# Altium footprint library MODULE.PcbLib: 35 footprints (part 1 of 3)
Each footprint in its own frame and in the unit in brackets; x right, y up, seen from the top. Pads: shape width x height; smd on the part's side, far side on the other; paste and mask are expansions set on the pad; w line width, h text height; cw(c..) or ccw(c..) is an arc to the next point about the centre after c.
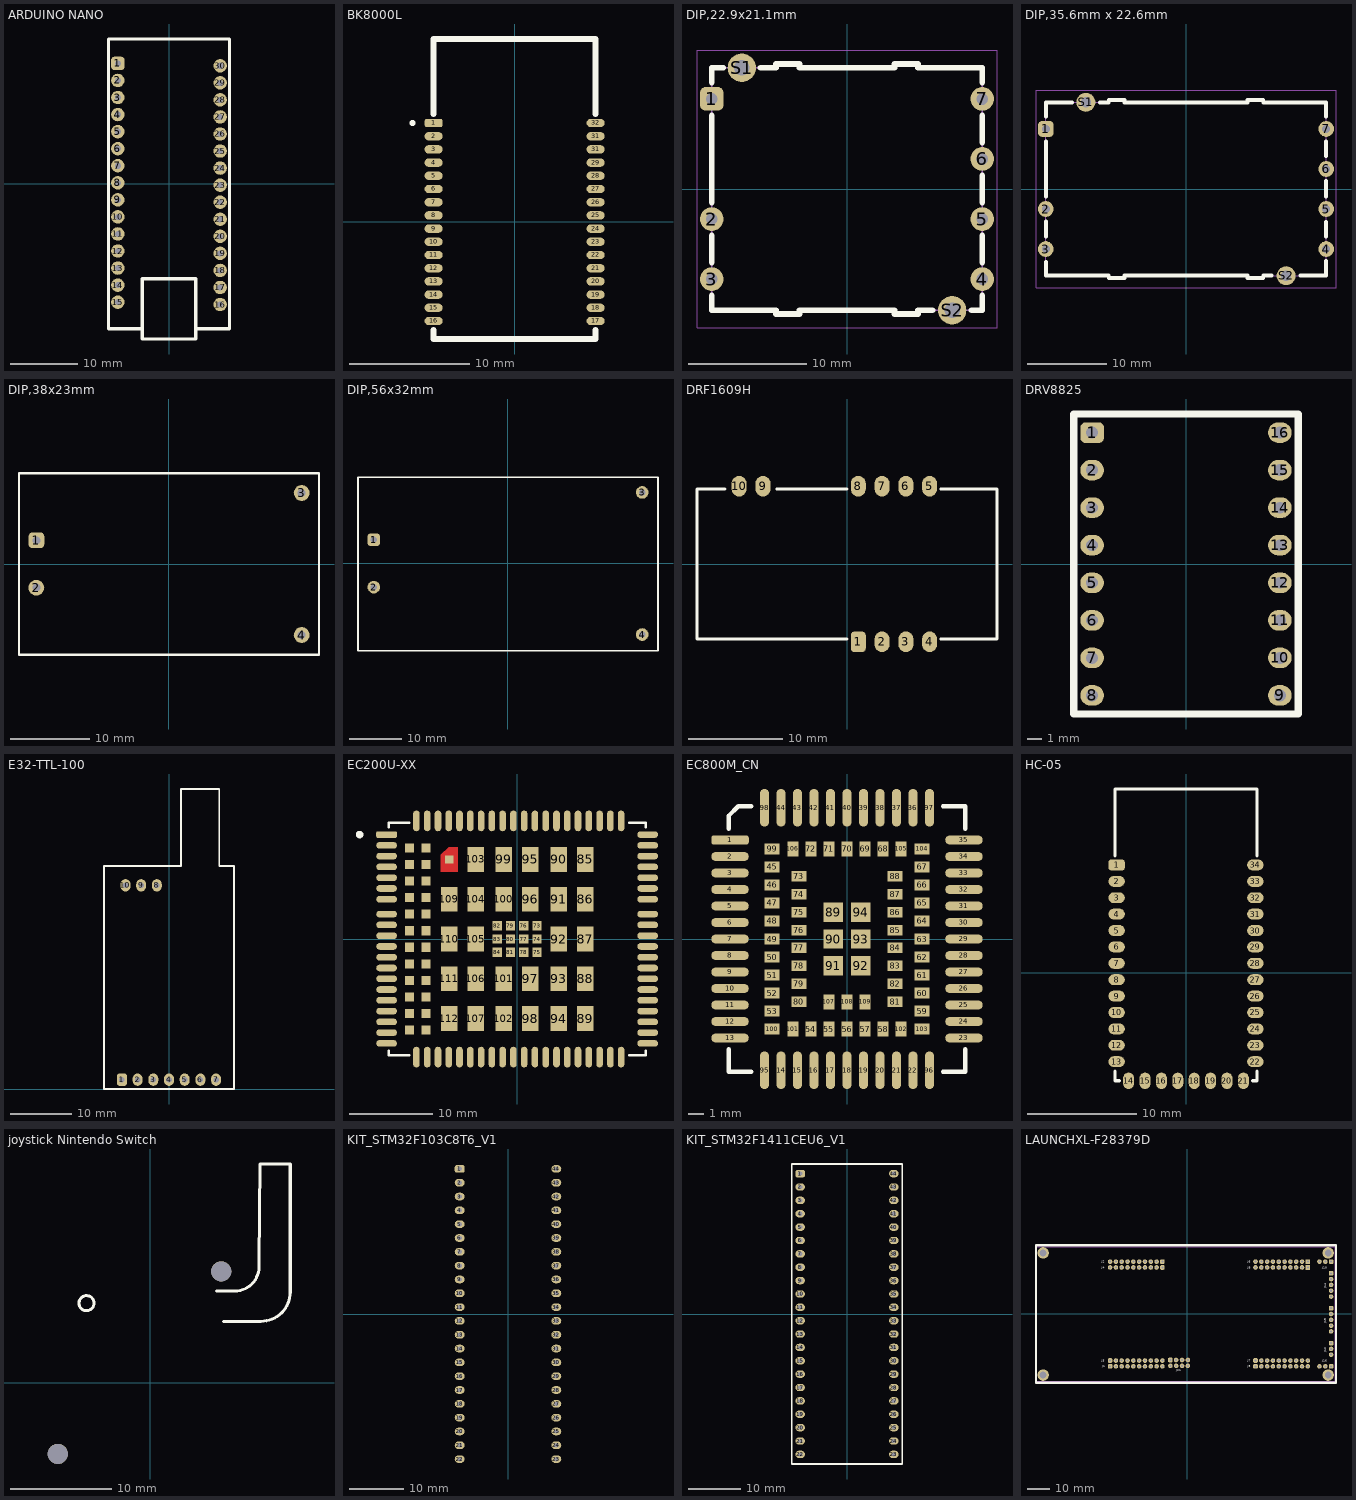
[diagram p0: the footprints below, top view; thin cyan lines are the x and y axes]

## ARDUINO NANO [mm]
pads (30):
  rrect50% 2x2 hole 0.9: 1(-7.62,17.955)
  round 2 hole 0.9: 2(-7.62,15.415) 3(-7.62,12.875) 4(-7.62,10.335) 5(-7.62,7.795) 6(-7.62,5.255) 7(-7.62,2.715) 8(-7.62,0.175) 9(-7.62,-2.365) 10(-7.62,-4.905) 11(-7.62,-7.445) 12(-7.62,-9.985) 13(-7.62,-12.525) 14(-7.62,-15.065) 15(-7.62,-17.605) 16(7.62,-17.955) 17(7.62,-15.415) 18(7.62,-12.875) 19(7.62,-10.335) 20(7.62,-7.795) 21(7.62,-5.255) 22(7.62,-2.715) 23(7.62,-0.175) 24(7.62,2.365) 25(7.62,4.905) 26(7.62,7.445) 27(7.62,9.985) 28(7.62,12.525) 29(7.62,15.065) 30(7.62,17.605)
Top Overlay:
  lines w0.5: -4,-21.59 -4,-23.09 4,-23.09 4,-21.59 ; -4,-21.59 -9,-21.59 -9,21.59 9,21.59 9,-21.59 4,-21.59 ; -4,-21.59 -4,-14.1 4,-14.1 4,-21.59
3D body "Arduino Nano.STEP": height 11.68, standoff -2, extent -9,-22.44 9,21.84

## BK8000L [mm]
pads (32):
  rrect50% 1.5x0.7 smd: 1(-6.75,8.25)
  oval 1.5x0.7 smd: 2(-6.75,7.15) 3(-6.75,6.05) 4(-6.75,4.95) 5(-6.75,3.85) 6(-6.75,2.75) 7(-6.75,1.65) 8(-6.75,0.55) 9(-6.75,-0.55) 10(-6.75,-1.65) 11(-6.75,-2.75) 12(-6.75,-3.85) 13(-6.75,-4.95) 14(-6.75,-6.05) 15(-6.75,-7.15) 16(-6.75,-8.25) 17(6.75,-8.25) 18(6.75,-7.15) 19(6.75,-6.05) 20(6.75,-4.95) 21(6.75,-3.85) 22(6.75,-2.75) 23(6.75,-1.65) 24(6.75,-0.55) 25(6.75,0.55) 26(6.75,1.65) 27(6.75,2.75) 28(6.75,3.85) 29(6.75,4.95) 31(6.75,6.05) 31(6.75,7.15) 32(6.75,8.25)
Top Overlay:
  circle w0.3: c-8.5,8.25 r0.1
  lines w0.5: -6.75,-9 -6.75,-9.75 6.75,-9.75 6.75,-9 ; -6.75,9 -6.75,15.25 6.75,15.25 6.75,9

## DIP,22.9x21.1mm [mm]
height 8.5
pads (9):
  rrect50% 2x2 hole 1 mask+0.2: 1(-11.43,7.62)
  round 2 hole 1 mask+0.2: 2(-11.43,-2.54) 3(-11.43,-7.62) 4(11.43,-7.62) 5(11.43,-2.54) 6(11.43,2.54) 7(11.43,7.62)
  round 2.4 hole 1.3 mask+0.2: S1(-8.89,10.25) S2(8.89,-10.25)
Top Overlay:
  lines w0.5: -11.43,-9.017 -11.43,-10.25 -6,-10.25 -6,-10.55 -4,-10.55 -4,-10.25 4,-10.25 4,-10.55 6,-10.55 6,-10.25 7.239,-10.25 ; -11.43,-6.223 -11.43,-3.937 ; -11.43,-1.143 -11.43,6.223 ; -11.43,9.017 -11.43,10.25 -10.46,10.25 ; -7.32,10.25 -6,10.25 -6,10.55 -4,10.55 -4,10.25 4,10.25 4,10.55 6,10.55 6,10.25 11.43,10.25 11.43,9.017 ; 10.541,-10.25 11.43,-10.25 11.43,-9.017 ; 11.43,-6.223 11.43,-3.937 ; 11.43,-1.143 11.43,1.143 ; 11.43,3.937 11.43,6.223
3D:
  lines w0.127: -11.43,-10.25 -6,-10.25 -6,-10.55 -4,-10.55 -4,-10.25 4,-10.25 4,-10.55 6,-10.55 6,-10.25 11.43,-10.25 11.43,10.25 6,10.25 6,10.55 4,10.55 4,10.25 -4,10.25 -4,10.55 -6,10.55 -6,10.25 -11.43,10.25 -11.43,-10.25
Mechanical 15:
  lines w0.05: -12.68,-11.75 -12.68,11.75 12.68,11.75 12.68,-11.75 -12.68,-11.75
3D body "step_temp.STEP": height 8.5, standoff -3.5, extent -11.58,-10.55 11.58,10.55

## DIP,35.6mm x 22.6mm [mm]
height 8.5
pads (9):
  rrect50% 2x2 hole 1 mask+0.2: 1(-17.78,7.62)
  round 2 hole 1 mask+0.2: 2(-17.78,-2.54) 3(-17.78,-7.62) 4(17.78,-7.62) 5(17.78,-2.54) 6(17.78,2.54) 7(17.78,7.62)
  round 2.4 hole 1.3 mask+0.2: S1(-12.7,11) S2(12.7,-11)
Top Overlay:
  lines w0.5: -17.78,-9.233 -17.78,-11 -9.8,-11 -9.8,-11.3 -7.8,-11.3 -7.8,-11 7.8,-11 7.8,-11.3 9.8,-11.3 9.8,-11 10.869,-11 ; -17.78,-6.06 -17.78,-4.124 ; -17.78,-0.933 -17.78,6.026 ; -17.78,9.178 -17.78,11 -14.449,11 ; -10.944,11 -9.8,11 -9.8,11.3 -7.8,11.3 -7.8,11 7.8,11 7.8,11.3 9.8,11.3 9.8,11 17.78,11 17.78,9.18 ; 14.501,-11 17.78,-11 17.78,-9.158 ; 17.78,-6.017 17.78,-4.175 ; 17.78,-0.984 17.78,1.01 ; 17.78,4.16 17.78,6.017
3D:
  lines w0.127: -17.78,-11 -17.78,11 -9.8,11 -9.8,11.3 -7.8,11.3 -7.8,11 7.8,11 7.8,11.3 9.8,11.3 9.8,11 17.78,11 17.78,-11 9.8,-11 9.8,-11.3 7.8,-11.3 7.8,-11 -7.8,-11 -7.8,-11.3 -9.8,-11.3 -9.8,-11 -17.78,-11
Mechanical 15:
  lines w0.05: -19.03,-12.5 -19.03,12.5 19.03,12.5 19.03,-12.5 -19.03,-12.5
3D body "step_temp.STEP": height 8.5, standoff -3.5, extent -17.93,-11.3 17.93,11.3

## DIP,38x23mm [mm]
pads (4):
  rrect50% 2x2 hole 1: 1(-16.8,3)
  round 2 hole 1: 2(-16.8,-3) 3(16.8,9) 4(16.8,-9)
Top Overlay:
  lines w0.3: -19,-11.5 -19,11.5 19,11.5 19,-11.5 -19,-11.5
3D:
  lines w0.127: -19,-11.5 19,-11.5 19,11.5 -19,11.5 -19,-11.5
3D body "step_temp.STEP": height 23, standoff 0, extent -19,-11.5 19,11.5

## DIP,56x32mm [mm]
pads (4):
  rrect50% 2.4x2.4 hole 1.2: 1(-25.5,4.5)
  round 2.4 hole 1.2: 2(-25.5,-4.5) 3(25.5,13.5) 4(25.5,-13.5)
Top Overlay:
  lines w0.3: -28.5,-16.6 28.5,-16.6 28.5,16.4 -28.5,16.4 -28.5,-16.6
3D body "step_temp.STEP": height 22.5, standoff -5, extent -28.5,-16.6 28.5,16.4

## DRF1609H [mm]
pads (10):
  rrect50% 1.6x2.2 smd: 1(1.2,-8.3)
  oval 1.6x2.2 smd: 2(3.74,-8.3) 3(6.28,-8.3) 4(8.82,-8.3) 5(8.82,8.3) 6(6.28,8.3) 7(3.74,8.3) 8(1.2,8.3) 9(-8.96,8.3) 10(-11.5,8.3)
Top Overlay:
  lines w0.3: -13,8 -16,8 -16,-8 0,-8 ; -7.5,8 0,8 ; 10,-8 16,-8 16,8 10,8
3D body "drf1609h.stp": height 2.5, standoff 0, extent -16,-8.21 16,8.21

## DRV8825 [mm]
pads (16):
  rrect50% 1.6x1.4 hole 0.8 mask+0.15: 1(-6.35,8.89)
  oval 1.6x1.4 hole 0.8 mask+0.15: 2(-6.35,6.35) 3(-6.35,3.81) 4(-6.35,1.27) 5(-6.35,-1.27) 6(-6.35,-3.81) 7(-6.35,-6.35) 8(-6.35,-8.89) 9(6.35,-8.89) 10(6.35,-6.35) 11(6.35,-3.81) 12(6.35,-1.27) 13(6.35,1.27) 14(6.35,3.81) 15(6.35,6.35) 16(6.35,8.89)
Top Overlay:
  lines w0.5: -7.6,-10.15 -7.6,10.15 7.6,10.15 7.6,-10.15 -7.6,-10.15
3D body "DRV8825-PBS-8x2-RADIATOR.stp": height 16.93, standoff -3.06, extent -7.498,-10.16 7.502,10.16

## E32-TTL-100 [mm]
pads (10):
  rrect50% 1.6x2 hole 0.9: 1(-7.62,1.52)
  oval 1.6x2 hole 0.9: 2(-5.08,1.52) 3(-2.54,1.52) 4(0,1.52) 5(2.54,1.52) 6(5.08,1.52) 7(7.62,1.52) 8(-1.97,33) 9(-4.51,33) 10(-7.05,33)
Top Overlay:
  lines w0.3: -10.55,0 -10.55,36.1 1.95,36.1 1.95,48.6 8.15,48.6 8.15,36.1 10.55,36.1 10.55,0 -10.55,0
3D body "E32-433T20DT[1].stp": height 8.1, standoff -5.52, extent -10.55,0 10.45,48.5

## EC200U-XX [mm]
pads (144):
  rrect50% 2.5x0.8 smd mask+0.15: 1(-15.75,12.6)
  oval 2.5x0.8 smd mask+0.15: 2(-15.75,11.3) 3(-15.75,10) 4(-15.75,8.7) 5(-15.75,7.4) 6(-15.75,6.1) 7(-15.75,4.8) 8(-15.75,0.4) 9(-15.75,-0.9) 10(-15.75,-2.2) 11(-15.75,-3.5) 12(-15.75,-4.8) 13(-15.75,-6.1) 14(-15.75,-7.4) 15(-15.75,-8.7) 16(-15.75,-10) 17(-15.75,-11.3) 18(-15.75,-12.6) 37(15.75,-12.6) 38(15.75,-11.3) 39(15.75,-10) 40(15.75,-8.7) 41(15.75,-7.4) 42(15.75,-6.1) 43(15.75,-4.8) 44(15.75,-3.5) 45(15.75,-2.2) 46(15.75,-0.9) 47(15.75,0.4) 48(15.75,4.8) 49(15.75,6.1) 50(15.75,7.4) 51(15.75,8.7) 52(15.75,10) 53(15.75,11.3) 54(15.75,12.6) 141(-15.75,3) 142(-15.75,1.7) 143(15.75,1.7) 144(15.75,3)
  oval 0.8x2.5 smd mask+0.15: 19(-9.55,-14.25) 20(-8.25,-14.25) 21(-6.95,-14.25) 22(-5.65,-14.25) 23(-4.35,-14.25) 24(-3.05,-14.25) 25(-1.75,-14.25) 26(-0.45,-14.25) 27(0.85,-14.25) 28(2.15,-14.25) 29(3.45,-14.25) 30(4.75,-14.25) 31(6.05,-14.25) 32(7.35,-14.25) 33(8.65,-14.25) 34(9.95,-14.25) 35(11.25,-14.25) 36(12.55,-14.25) 55(12.55,14.25) 56(11.25,14.25) 57(9.95,14.25) 58(8.65,14.25) 59(7.35,14.25) 60(6.05,14.25) 61(4.75,14.25) 62(3.45,14.25) 63(2.15,14.25) 64(0.85,14.25) 65(-0.45,14.25) 66(-1.75,14.25) 67(-3.05,14.25) 68(-4.35,14.25) 69(-5.65,14.25) 70(-6.95,14.25) 71(-8.25,14.25) 72(-9.55,14.25) 113(-10.85,14.25) 114(-12.15,14.25) 115(-10.85,-14.25) 116(-12.15,-14.25)
  rect 1.1x1.1 smd mask+0.15: 73(2.4,1.6) 74(2.4,0) 75(2.4,-1.6) 76(0.8,1.6) 77(0.8,0) 78(0.8,-1.6) 79(-0.8,1.6) 80(-0.8,0) 81(-0.8,-1.6) 82(-2.4,1.6) 83(-2.4,0) 84(-2.4,-1.6) 117(-11,11) 118(-11,9) 119(-11,7) 120(-11,5) 121(-11,3) 122(-11,1) 123(-11,-1) 124(-11,-3) 125(-11,-5) 126(-11,-7) 127(-11,-9) 128(-11,-11) 129(-13,11) 130(-13,9) 131(-13,7) 132(-13,5) 133(-13,3) 134(-13,1) 135(-13,-1) 136(-13,-3) 137(-13,-5) 138(-13,-7) 139(-13,-9) 140(-13,-11)
  rect 2x3 smd mask+0.15: 85(8.2,9.6) 86(8.2,4.8) 87(8.2,0) 88(8.2,-4.8) 89(8.2,-9.6) 90(5,9.6) 91(5,4.8) 92(5,0) 93(5,-4.8) 94(5,-9.6) 95(1.6,9.6) 96(1.6,4.8) 97(1.6,-4.8) 98(1.6,-9.6) 99(-1.6,9.6) 100(-1.6,4.8) 101(-1.6,-4.8) 102(-1.6,-9.6) 103(-5,9.6) 104(-5,4.8) 105(-5,0) 106(-5,-4.8) 107(-5,-9.6) 109(-8.2,4.8) 110(-8.2,0) 111(-8.2,-4.8) 112(-8.2,-9.6)
  rect 1x1 smd paste-1 mask+0: 108(-8.2,9.6)
Top Layer:
  region: -7.15,8.1 -9.2,8.1 -9.2,10.15 -8.25,11.1 -7.15,11.1
Top Overlay:
  circle w0.5: c-19,12.6 r0.2
  lines w0.3: -15.5,-13.5 -15.5,-14 -13,-14 ; -15.5,13.5 -15.5,14 -13,14 ; 13.5,-14 15.5,-14 15.5,-13.5 ; 13.5,14 15.5,14 15.5,13.5
Top Paste:
  region: -7.15,8.1 -9.2,8.1 -9.2,10 -8.1,11.1 -7.15,11.1
Top Solder:
  region: -7,7.95 -9.35,7.95 -9.35,10.25 -8.35,11.25 -7,11.25
3D body "EC200UCNAA-N05-SGNSA--3DModel-STEP-258128.STEP": height 2.55, standoff 0.2, extent -15.5,-14 15.5,14

## EC800M_CN [mm]
pads (109):
  rrect50% 2.5x0.6 smd: 1(-7.8,6.6)
  oval 2.5x0.6 smd: 2(-7.8,5.5) 3(-7.8,4.4) 4(-7.8,3.3) 5(-7.8,2.2) 6(-7.8,1.1) 7(-7.8,0) 8(-7.8,-1.1) 9(-7.8,-2.2) 10(-7.8,-3.3) 11(-7.8,-4.4) 12(-7.8,-5.5) 13(-7.8,-6.6) 23(7.8,-6.6) 24(7.8,-5.5) 25(7.8,-4.4) 26(7.8,-3.3) 27(7.8,-2.2) 28(7.8,-1.1) 29(7.8,0) 30(7.8,1.1) 31(7.8,2.2) 32(7.8,3.3) 33(7.8,4.4) 34(7.8,5.5) 35(7.8,6.6)
  oval 0.6x2.5 smd: 14(-4.4,-8.75) 15(-3.3,-8.75) 16(-2.2,-8.75) 17(-1.1,-8.75) 18(0,-8.75) 19(1.1,-8.75) 20(2.2,-8.75) 21(3.3,-8.75) 22(4.4,-8.75) 36(4.4,8.75) 37(3.3,8.75) 38(2.2,8.75) 39(1.1,8.75) 40(0,8.75) 41(-1.1,8.75) 42(-2.2,8.75) 43(-3.3,8.75) 44(-4.4,8.75) 95(-5.5,-8.75) 96(5.5,-8.75) 97(5.5,8.75) 98(-5.5,8.75)
  rect 1x0.7 smd: 45(-5,4.8) 46(-5,3.6) 47(-5,2.4) 48(-5,1.2) 49(-5,0) 50(-5,-1.2) 51(-5,-2.4) 52(-5,-3.6) 53(-5,-4.8) 59(5,-4.8) 60(5,-3.6) 61(5,-2.4) 62(5,-1.2) 63(5,0) 64(5,1.2) 65(5,2.4) 66(5,3.6) 67(5,4.8) 73(-3.2,4.2) 74(-3.2,3) 75(-3.2,1.8) 76(-3.2,0.6) 77(-3.2,-0.6) 78(-3.2,-1.8) 79(-3.2,-3) 80(-3.2,-4.2) 81(3.2,-4.2) 82(3.2,-3) 83(3.2,-1.8) 84(3.2,-0.6) 85(3.2,0.6) 86(3.2,1.8) 87(3.2,3) 88(3.2,4.2) 99(-5,6) 100(-5,-6) 103(5,-6) 104(5,6)
  rect 0.7x1 smd: 54(-2.4,-6) 55(-1.2,-6) 56(0,-6) 57(1.2,-6) 58(2.4,-6) 68(2.4,6) 69(1.2,6) 70(0,6) 71(-1.2,6) 72(-2.4,6) 101(-3.6,-6) 102(3.6,-6) 105(3.6,6) 106(-3.6,6) 107(-1.2,-4.2) 108(0,-4.2) 109(1.2,-4.2)
  rect 1.3x1.3 smd: 89(-0.9,1.8) 90(-0.9,0) 91(-0.9,-1.8) 92(0.9,-1.8) 93(0.9,0) 94(0.9,1.8)
Top Overlay:
  lines w0.3: -7.9,-7.35 -7.9,-8.85 -6.4,-8.85 ; -7.9,7.35 -7.9,8.2 -7.25,8.85 -6.4,8.85 ; 6.4,-8.85 7.9,-8.85 7.9,-7.35 ; 6.4,8.85 7.9,8.85 7.9,7.35
3D body "Quectel_EC800M-CN_3D_Dimensions_V1.0[1].stp": height 2.45, standoff 0.05, extent -7.9,-8.85 7.9,8.85

## HC-05 [mm]
pads (34):
  rrect50% 1.5x1 smd mask+0.1: 1(-6.35,9.875)
  oval 1.5x1 smd mask+0.1: 2(-6.35,8.375) 3(-6.35,6.875) 4(-6.35,5.375) 5(-6.35,3.875) 6(-6.35,2.375) 7(-6.35,0.875) 8(-6.35,-0.625) 9(-6.35,-2.125) 10(-6.35,-3.625) 11(-6.35,-5.125) 12(-6.35,-6.625) 13(-6.35,-8.125) 22(6.35,-8.125) 23(6.35,-6.625) 24(6.35,-5.125) 25(6.35,-3.625) 26(6.35,-2.125) 27(6.35,-0.625) 28(6.35,0.875) 29(6.35,2.375) 30(6.35,3.875) 31(6.35,5.375) 32(6.35,6.875) 33(6.35,8.375) 34(6.35,9.875)
  oval 1x1.5 smd mask+0.1: 14(-5.25,-9.875) 15(-3.75,-9.875) 16(-2.25,-9.875) 17(-0.75,-9.875) 18(0.75,-9.875) 19(2.25,-9.875) 20(3.75,-9.875) 21(5.25,-9.875)
Top Overlay:
  lines w0.3: -6.5,-8.975 -6.5,-9.875 -6.1,-9.875 ; -6.5,10.725 -6.5,16.825 6.5,16.825 6.5,10.725 ; 6.1,-9.875 6.5,-9.875 6.5,-8.975
3D body "HC05.STEP": height 2.5, standoff 0, extent -6.5,-9.875 6.5,16.825

## joystick Nintendo Switch [mm]
pads (2):
  round 2 hole 2 mask+0.1: ""(-9.15,-7.05) ""(7.05,11.05)
Top Overlay:
  circle w0.3: c-6.3,7.9 r0.75
  lines w0.3: 6.6,9.1 8.41,9.1 ccw(c8.41,11.49) 10.8,11.49 10.8,12 10.9,21.7 13.9,21.7 13.9,9 cw(c11,9) 11,6.1 7.3,6.1
3D body "JoyCon Switch Joystick.step": height 14.3, standoff -0.02, extent -11.55,-8.831 13.9,21.7

## KIT_STM32F103C8T6_V1 [mm]
pads (44):
  rrect50% 1.8x1.4 hole 0.8: 1(-8.89,26.67)
  oval 1.8x1.4 hole 0.8: 2(-8.89,24.13) 3(-8.89,21.59) 4(-8.89,19.05) 5(-8.89,16.51) 6(-8.89,13.97) 7(-8.89,11.43) 8(-8.89,8.89) 9(-8.89,6.35) 10(-8.89,3.81) 11(-8.89,1.27) 12(-8.89,-1.27) 13(-8.89,-3.81) 14(-8.89,-6.35) 15(-8.89,-8.89) 16(-8.89,-11.43) 17(-8.89,-13.97) 18(-8.89,-16.51) 19(-8.89,-19.05) 20(-8.89,-21.59) 21(-8.89,-24.13) 22(-8.89,-26.67) 23(8.89,-26.67) 24(8.89,-24.13) 25(8.89,-21.59) 26(8.89,-19.05) 27(8.89,-16.51) 28(8.89,-13.97) 29(8.89,-11.43) 30(8.89,-8.89) 31(8.89,-6.35) 32(8.89,-3.81) 33(8.89,-1.27) 34(8.89,1.27) 35(8.89,3.81) 36(8.89,6.35) 37(8.89,8.89) 38(8.89,11.43) 39(8.89,13.97) 40(8.89,16.51) 41(8.89,19.05) 42(8.89,21.59) 43(8.89,24.13) 44(8.89,26.67)
3D body "KIT_STM32F103C8T6_V1.step": height 14.79, standoff -3.19, extent -10.5,-28.68 10.5,28.68

## KIT_STM32F1411CEU6_V1 [mm]
pads (44):
  rrect50% 1.8x1.4 hole 0.8: 1(-8.89,26.67)
  oval 1.8x1.4 hole 0.8: 2(-8.89,24.13) 3(-8.89,21.59) 4(-8.89,19.05) 5(-8.89,16.51) 6(-8.89,13.97) 7(-8.89,11.43) 8(-8.89,8.89) 9(-8.89,6.35) 10(-8.89,3.81) 11(-8.89,1.27) 12(-8.89,-1.27) 13(-8.89,-3.81) 14(-8.89,-6.35) 15(-8.89,-8.89) 16(-8.89,-11.43) 17(-8.89,-13.97) 18(-8.89,-16.51) 19(-8.89,-19.05) 20(-8.89,-21.59) 21(-8.89,-24.13) 22(-8.89,-26.67) 23(8.89,-26.67) 24(8.89,-24.13) 25(8.89,-21.59) 26(8.89,-19.05) 27(8.89,-16.51) 28(8.89,-13.97) 29(8.89,-11.43) 30(8.89,-8.89) 31(8.89,-6.35) 32(8.89,-3.81) 33(8.89,-1.27) 34(8.89,1.27) 35(8.89,3.81) 36(8.89,6.35) 37(8.89,8.89) 38(8.89,11.43) 39(8.89,13.97) 40(8.89,16.51) 41(8.89,19.05) 42(8.89,21.59) 43(8.89,24.13) 44(8.89,26.67)
Top Overlay:
  lines w0.3: -10.5,-28.5 -10.5,28.5 10.5,28.5 10.5,-28.5 -10.5,-28.5
3D body "PCB.step": height 15.79, standoff -2.19, extent -10.5,-28.68 10.5,28.68

## LAUNCHXL-F28379D [mm]
pads (111):
  rrect50% 2x2 hole 0.9: J1_1(-33.655,-22.86) J2_1(-10.795,22.86) J3_1(-33.655,-20.32) J4_1(-10.795,20.32) J5_1(29.845,-22.86) J7_1(29.845,-20.32) J10_1(62.865,22.86) J12_1(62.865,-12.7) J14_1(62.865,17.78) J15_1(62.865,2.54) J16_1(62.865,-22.86) J21_1(-7.311,-20.086)
  round 2 hole 0.9: J1_2(-31.115,-22.86) J1_3(-28.575,-22.86) J1_4(-26.035,-22.86) J1_5(-23.495,-22.86) J1_6(-20.955,-22.86) J1_7(-18.415,-22.86) J1_8(-15.875,-22.86) J1_9(-13.335,-22.86) J1_10(-10.795,-22.86) J2_2(-13.335,22.86) J2_3(-15.875,22.86) J2_4(-18.415,22.86) J2_5(-20.955,22.86) J2_6(-23.495,22.86) J2_7(-26.035,22.86) J2_8(-28.575,22.86) J2_9(-31.115,22.86) J2_10(-33.655,22.86) J3_2(-31.115,-20.32) J3_3(-28.575,-20.32) J3_4(-26.035,-20.32) J3_5(-23.495,-20.32) J3_6(-20.955,-20.32) J3_7(-18.415,-20.32) J3_8(-15.875,-20.32) J3_9(-13.335,-20.32) J3_10(-10.795,-20.32) J4_2(-13.335,20.32) J4_3(-15.875,20.32) J4_4(-18.415,20.32) J4_5(-20.955,20.32) J4_6(-23.495,20.32) J4_7(-26.035,20.32) J4_8(-28.575,20.32) J4_9(-31.115,20.32) J4_10(-33.655,20.32) J5_2(32.385,-22.86) J5_3(34.925,-22.86) J5_4(37.465,-22.86) J5_5(40.005,-22.86) J5_6(42.545,-22.86) J5_7(45.085,-22.86) J5_8(47.625,-22.86) J5_9(50.165,-22.86) J5_10(52.705,-22.86) J6_2(50.165,22.86) J6_3(47.625,22.86) J6_4(45.085,22.86) J6_5(42.545,22.86) J6_6(40.005,22.86) J6_7(37.465,22.86) J6_8(34.925,22.86) J6_9(32.385,22.86) J6_10(29.845,22.86) J7_2(32.385,-20.32) J7_3(34.925,-20.32) J7_4(37.465,-20.32) J7_5(40.005,-20.32) J7_6(42.545,-20.32) J7_7(45.085,-20.32) J7_8(47.625,-20.32) J7_9(50.165,-20.32) J7_10(52.705,-20.32) J8_2(50.165,20.32) J8_3(47.625,20.32) J8_4(45.085,20.32) J8_5(42.545,20.32) J8_6(40.005,20.32) J8_7(37.465,20.32) J8_8(34.925,20.32) J8_9(32.385,20.32) J8_10(29.845,20.32) J10_2(60.325,22.86) J10_3(57.785,22.86) J12_2(62.865,-15.24) J12_3(62.865,-17.78) J14_2(62.865,15.24) J14_3(62.865,12.7) J14_4(62.865,10.16) J14_5(62.865,7.62) J15_2(62.865,0) J15_3(62.865,-2.54) J15_4(62.865,-5.08) J15_5(62.865,-7.62) J16_2(60.325,-22.86) J16_3(57.785,-22.86) J21_2(-7.311,-22.626) J21_3(-4.771,-20.086) J21_4(-4.771,-22.626) J21_5(-2.231,-20.086) J21_6(-2.231,-22.626) J21_7(0.309,-20.086) J21_8(0.309,-22.626)
  rect 2x2 hole 0.9: J6_1(52.705,22.86) J8_1(52.705,20.32)
  round 5 hole 3 unplated: ""(-62.865,-26.67) ""(-62.865,26.67) ""(61.595,-26.67) ""(61.595,26.67)
Top Overlay:
  lines w1: -66,-30 -66,30 65,30 65,-30 -66,-30
  text "J6" at 26.467,22.36 h1
  text "J8" at 26.467,19.82 h1
  text "J14" at 60.7,11.35 h1
  text "J16" at 58.95,-20.8 h1
  text "J12" at 60.7,-16.65 h1
  text "J15" at 60.7,-4.05 h1
  text "J10" at 58.95,19.8 h1
  text "J21" at -4.666,-25 h1
  text "J5" at 26.467,-23.36 h1
  text "J7" at 26.467,-20.82 h1
  text "J4" at -37.333,19.82 h1
  text "J2" at -37.333,22.36 h1
  text "J3" at -37.333,-20.82 h1
  text "J1" at -37.166,-23.36 h1
Mechanical 15:
  lines w0.05: -65.655,-29.46 -65.655,29.46 64.639,29.46 64.639,-29.46 -65.655,-29.46
3D body "LAUNCHXL-F28379D--3DModel-STEP-56544.STEP": height 19.15, standoff 0.39, extent -66.395,-29.21 64.397,31.485